# Altium footprint library smd-ipc.PCBLIB: 363 footprints (part 13 of 27)
Each footprint in its own frame and in the unit in brackets; x right, y up, seen from the top. Pads: shape width x height; smd on the part's side, far side on the other; paste and mask are expansions set on the pad; w line width, h text height; cw(c..) or ccw(c..) is an arc to the next point about the centre after c.
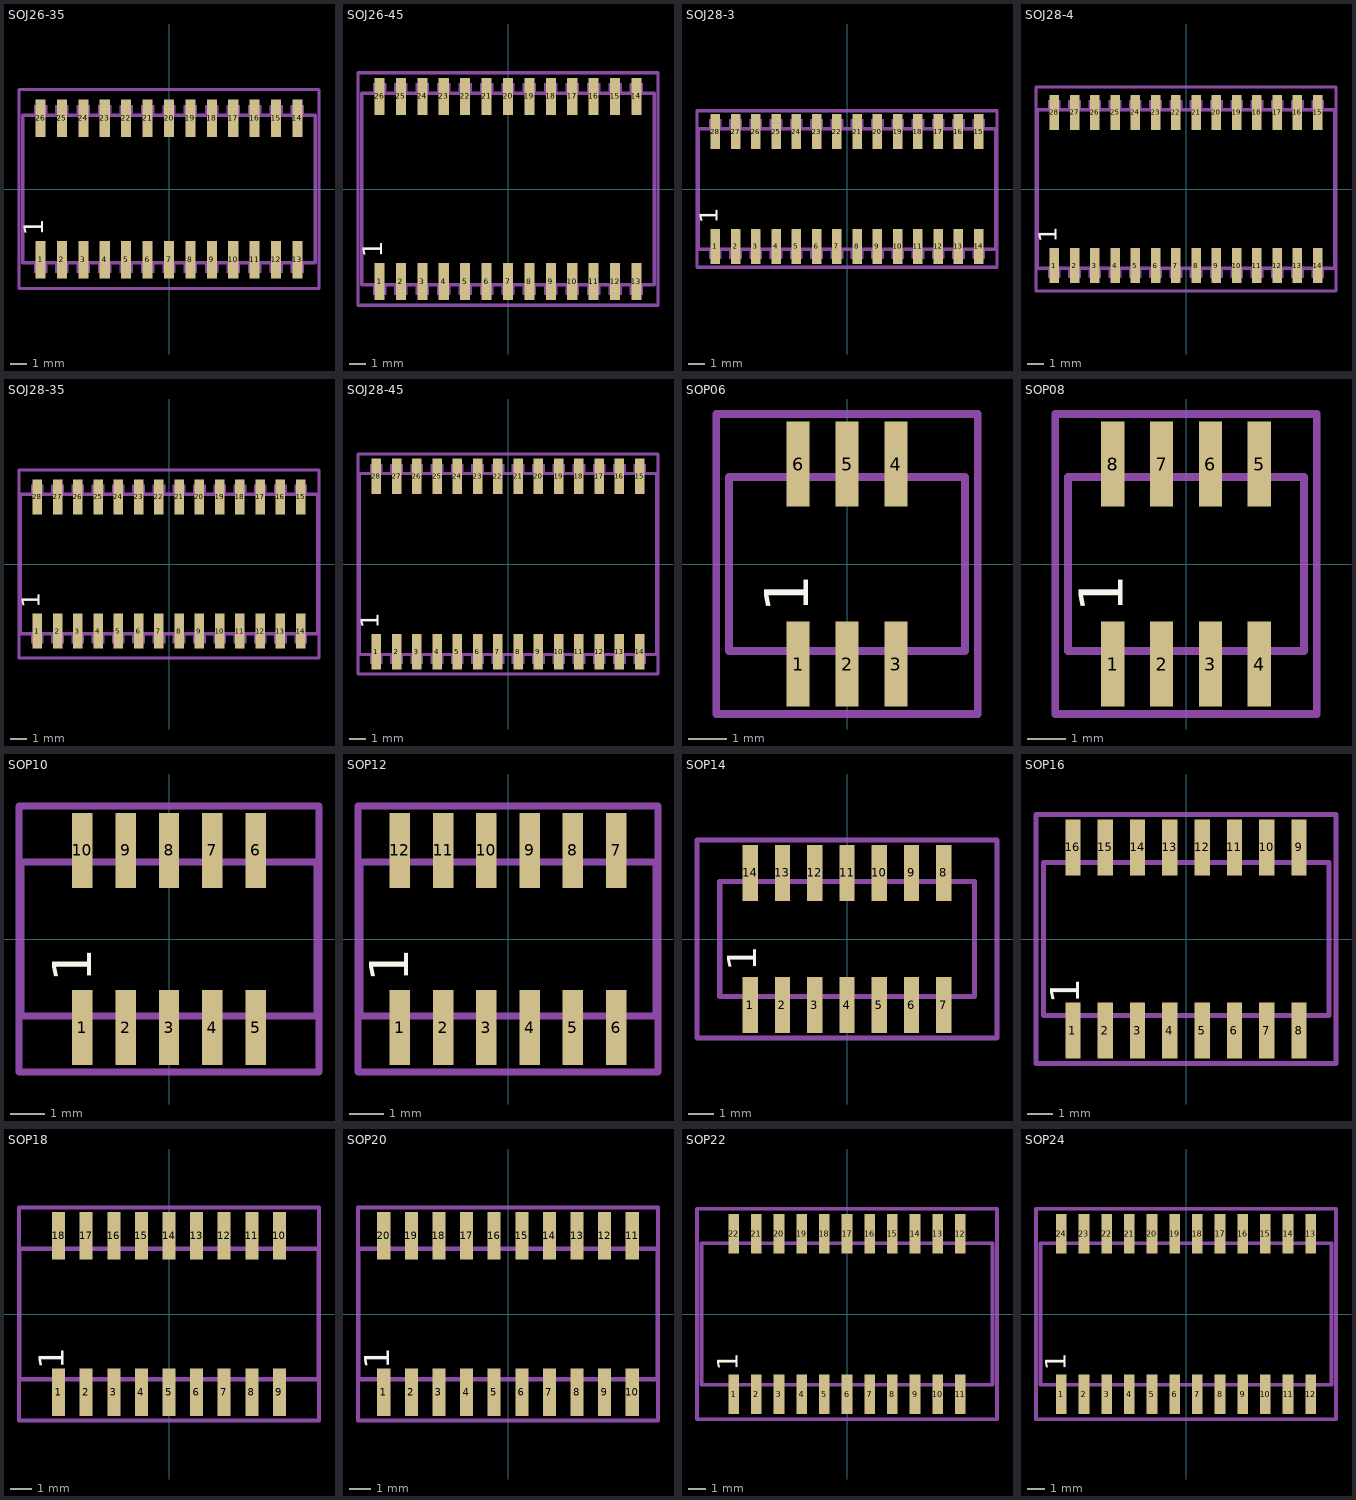
[diagram p12: the footprints below, top view; thin cyan lines are the x and y axes]

## SOJ26-35 [mm]
pads (26):
  rect 0.6x2.2 smd: 1(-7.62,-4.2) 2(-6.35,-4.2) 3(-5.08,-4.2) 4(-3.81,-4.2) 5(-2.54,-4.2) 6(-1.27,-4.2) 7(0,-4.2) 8(1.27,-4.2) 9(2.54,-4.2) 10(3.81,-4.2) 11(5.08,-4.2) 12(6.35,-4.2) 13(7.62,-4.2) 14(7.62,4.2) 15(6.35,4.2) 16(5.08,4.2) 17(3.81,4.2) 18(2.54,4.2) 19(1.27,4.2) 20(0,4.2) 21(-1.27,4.2) 22(-2.54,4.2) 23(-3.81,4.2) 24(-5.08,4.2) 25(-6.35,4.2) 26(-7.62,4.2)
Top Overlay:
  text "1" at -7.075,-2.77 h1.97
Mechanical 16:
  rectangle: -7.87,-4.27 -7.37,-3.13
  rectangle: -8.02,-4.98 -7.22,-4.47
  rectangle: -6.6,-4.27 -6.1,-3.13
  rectangle: -6.75,-4.98 -5.95,-4.47
  rectangle: -5.33,-4.27 -4.83,-3.13
  rectangle: -5.48,-4.98 -4.68,-4.47
  rectangle: -4.06,-4.27 -3.56,-3.13
  rectangle: -4.21,-4.98 -3.41,-4.47
  rectangle: -2.79,-4.27 -2.29,-3.13
  rectangle: -2.94,-4.98 -2.14,-4.47
  rectangle: -1.52,-4.27 -1.02,-3.13
  rectangle: -1.67,-4.98 -0.87,-4.47
  rectangle: -0.25,-4.27 0.25,-3.13
  rectangle: -0.4,-4.98 0.4,-4.47
  rectangle: 1.02,-4.27 1.52,-3.13
  rectangle: 0.87,-4.98 1.67,-4.47
  rectangle: 2.29,-4.27 2.79,-3.13
  rectangle: 2.14,-4.98 2.94,-4.47
  rectangle: 3.56,-4.27 4.06,-3.13
  rectangle: 3.41,-4.98 4.21,-4.47
  rectangle: 4.83,-4.27 5.33,-3.13
  rectangle: 4.68,-4.98 5.48,-4.47
  rectangle: 6.1,-4.27 6.6,-3.13
  rectangle: 5.95,-4.98 6.75,-4.47
  rectangle: 7.37,-4.27 7.87,-3.13
  rectangle: 7.22,-4.98 8.02,-4.47
  rectangle: 7.37,3.13 7.87,4.27
  rectangle: 7.22,4.47 8.02,4.98
  rectangle: 6.1,3.13 6.6,4.27
  rectangle: 5.95,4.47 6.75,4.98
  rectangle: 4.83,3.13 5.33,4.27
  rectangle: 4.68,4.47 5.48,4.98
  rectangle: 3.56,3.13 4.06,4.27
  rectangle: 3.41,4.47 4.21,4.98
  rectangle: 2.29,3.13 2.79,4.27
  rectangle: 2.14,4.47 2.94,4.98
  rectangle: 1.02,3.13 1.52,4.27
  rectangle: 0.87,4.47 1.67,4.98
  rectangle: -0.25,3.13 0.25,4.27
  rectangle: -0.4,4.47 0.4,4.98
  rectangle: -1.52,3.13 -1.02,4.27
  rectangle: -1.67,4.47 -0.87,4.98
  rectangle: -2.79,3.13 -2.29,4.27
  rectangle: -2.94,4.47 -2.14,4.98
  rectangle: -4.06,3.13 -3.56,4.27
  rectangle: -4.21,4.47 -3.41,4.98
  rectangle: -5.33,3.13 -4.83,4.27
  rectangle: -5.48,4.47 -4.68,4.98
  rectangle: -6.6,3.13 -6.1,4.27
  rectangle: -6.75,4.47 -5.95,4.98
  rectangle: -7.87,3.13 -7.37,4.27
  rectangle: -8.02,4.47 -7.22,4.98
  lines w0.203: -8.685,-4.37 8.675,-4.37 8.675,4.37 -8.685,4.37 -8.685,-4.37
Mechanical 27:
  lines w0.2: -8.9,-5.9 -8.9,5.9 8.9,5.9 8.9,-5.9 -8.9,-5.9

## SOJ26-45 [mm]
pads (26):
  rect 0.6x2.2 smd: 1(-7.62,-5.5) 2(-6.35,-5.5) 3(-5.08,-5.5) 4(-3.81,-5.5) 5(-2.54,-5.5) 6(-1.27,-5.5) 7(0,-5.5) 8(1.27,-5.5) 9(2.54,-5.5) 10(3.81,-5.5) 11(5.08,-5.5) 12(6.35,-5.5) 13(7.62,-5.5) 14(7.62,5.5) 15(6.35,5.5) 16(5.08,5.5) 17(3.81,5.5) 18(2.54,5.5) 19(1.27,5.5) 20(0,5.5) 21(-1.27,5.5) 22(-2.54,5.5) 23(-3.81,5.5) 24(-5.08,5.5) 25(-6.35,5.5) 26(-7.62,5.5)
Top Overlay:
  text "1" at -7.075,-4.07 h1.97
Mechanical 16:
  rectangle: -7.87,-5.57 -7.37,-4.43
  rectangle: -8.02,-6.28 -7.22,-5.77
  rectangle: -6.6,-5.57 -6.1,-4.43
  rectangle: -6.75,-6.28 -5.95,-5.77
  rectangle: -5.33,-5.57 -4.83,-4.43
  rectangle: -5.48,-6.28 -4.68,-5.77
  rectangle: -4.06,-5.57 -3.56,-4.43
  rectangle: -4.21,-6.28 -3.41,-5.77
  rectangle: -2.79,-5.57 -2.29,-4.43
  rectangle: -2.94,-6.28 -2.14,-5.77
  rectangle: -1.52,-5.57 -1.02,-4.43
  rectangle: -1.67,-6.28 -0.87,-5.77
  rectangle: -0.25,-5.57 0.25,-4.43
  rectangle: -0.4,-6.28 0.4,-5.77
  rectangle: 1.02,-5.57 1.52,-4.43
  rectangle: 0.87,-6.28 1.67,-5.77
  rectangle: 2.29,-5.57 2.79,-4.43
  rectangle: 2.14,-6.28 2.94,-5.77
  rectangle: 3.56,-5.57 4.06,-4.43
  rectangle: 3.41,-6.28 4.21,-5.77
  rectangle: 4.83,-5.57 5.33,-4.43
  rectangle: 4.68,-6.28 5.48,-5.77
  rectangle: 6.1,-5.57 6.6,-4.43
  rectangle: 5.95,-6.28 6.75,-5.77
  rectangle: 7.37,-5.57 7.87,-4.43
  rectangle: 7.22,-6.28 8.02,-5.77
  rectangle: 7.37,4.43 7.87,5.57
  rectangle: 7.22,5.77 8.02,6.28
  rectangle: 6.1,4.43 6.6,5.57
  rectangle: 5.95,5.77 6.75,6.28
  rectangle: 4.83,4.43 5.33,5.57
  rectangle: 4.68,5.77 5.48,6.28
  rectangle: 3.56,4.43 4.06,5.57
  rectangle: 3.41,5.77 4.21,6.28
  rectangle: 2.29,4.43 2.79,5.57
  rectangle: 2.14,5.77 2.94,6.28
  rectangle: 1.02,4.43 1.52,5.57
  rectangle: 0.87,5.77 1.67,6.28
  rectangle: -0.25,4.43 0.25,5.57
  rectangle: -0.4,5.77 0.4,6.28
  rectangle: -1.52,4.43 -1.02,5.57
  rectangle: -1.67,5.77 -0.87,6.28
  rectangle: -2.79,4.43 -2.29,5.57
  rectangle: -2.94,5.77 -2.14,6.28
  rectangle: -4.06,4.43 -3.56,5.57
  rectangle: -4.21,5.77 -3.41,6.28
  rectangle: -5.33,4.43 -4.83,5.57
  rectangle: -5.48,5.77 -4.68,6.28
  rectangle: -6.6,4.43 -6.1,5.57
  rectangle: -6.75,5.77 -5.95,6.28
  rectangle: -7.87,4.43 -7.37,5.57
  rectangle: -8.02,5.77 -7.22,6.28
  lines w0.203: -8.685,-5.67 8.675,-5.67 8.675,5.67 -8.685,5.67 -8.685,-5.67
Mechanical 27:
  lines w0.2: -8.9,-6.9 -8.9,6.9 8.9,6.9 8.9,-6.9 -8.9,-6.9

## SOJ28-3 [mm]
pads (28):
  rect 0.6x2.2 smd: 1(-8.255,-3.6) 2(-6.985,-3.6) 3(-5.715,-3.6) 4(-4.445,-3.6) 5(-3.175,-3.6) 6(-1.905,-3.6) 7(-0.635,-3.6) 8(0.635,-3.6) 9(1.905,-3.6) 10(3.175,-3.6) 11(4.445,-3.6) 12(5.715,-3.6) 13(6.985,-3.6) 14(8.255,-3.6) 15(8.255,3.6) 16(6.985,3.6) 17(5.715,3.6) 18(4.445,3.6) 19(3.175,3.6) 20(1.905,3.6) 21(0.635,3.6) 22(-0.635,3.6) 23(-1.905,3.6) 24(-3.175,3.6) 25(-4.445,3.6) 26(-5.715,3.6) 27(-6.985,3.6) 28(-8.255,3.6)
Top Overlay:
  text "1" at -7.71,-2.17 h1.97
Mechanical 16:
  rectangle: -8.505,-3.67 -8.005,-2.53
  rectangle: -8.655,-4.38 -7.855,-3.87
  rectangle: -7.235,-3.67 -6.735,-2.53
  rectangle: -7.385,-4.38 -6.585,-3.87
  rectangle: -5.965,-3.67 -5.465,-2.53
  rectangle: -6.115,-4.38 -5.315,-3.87
  rectangle: -4.695,-3.67 -4.195,-2.53
  rectangle: -4.845,-4.38 -4.045,-3.87
  rectangle: -3.425,-3.67 -2.925,-2.53
  rectangle: -3.575,-4.38 -2.775,-3.87
  rectangle: -2.155,-3.67 -1.655,-2.53
  rectangle: -2.305,-4.38 -1.505,-3.87
  rectangle: -0.885,-3.67 -0.385,-2.53
  rectangle: -1.035,-4.38 -0.235,-3.87
  rectangle: 0.385,-3.67 0.885,-2.53
  rectangle: 0.235,-4.38 1.035,-3.87
  rectangle: 1.655,-3.67 2.155,-2.53
  rectangle: 1.505,-4.38 2.305,-3.87
  rectangle: 2.925,-3.67 3.425,-2.53
  rectangle: 2.775,-4.38 3.575,-3.87
  rectangle: 4.195,-3.67 4.695,-2.53
  rectangle: 4.045,-4.38 4.845,-3.87
  rectangle: 5.465,-3.67 5.965,-2.53
  rectangle: 5.315,-4.38 6.115,-3.87
  rectangle: 6.735,-3.67 7.235,-2.53
  rectangle: 6.585,-4.38 7.385,-3.87
  rectangle: 8.005,-3.67 8.505,-2.53
  rectangle: 7.855,-4.38 8.655,-3.87
  rectangle: 8.005,2.53 8.505,3.67
  rectangle: 7.855,3.87 8.655,4.38
  rectangle: 6.735,2.53 7.235,3.67
  rectangle: 6.585,3.87 7.385,4.38
  rectangle: 5.465,2.53 5.965,3.67
  rectangle: 5.315,3.87 6.115,4.38
  rectangle: 4.195,2.53 4.695,3.67
  rectangle: 4.045,3.87 4.845,4.38
  rectangle: 2.925,2.53 3.425,3.67
  rectangle: 2.775,3.87 3.575,4.38
  rectangle: 1.655,2.53 2.155,3.67
  rectangle: 1.505,3.87 2.305,4.38
  rectangle: 0.385,2.53 0.885,3.67
  rectangle: 0.235,3.87 1.035,4.38
  rectangle: -0.885,2.53 -0.385,3.67
  rectangle: -1.035,3.87 -0.235,4.38
  rectangle: -2.155,2.53 -1.655,3.67
  rectangle: -2.305,3.87 -1.505,4.38
  rectangle: -3.425,2.53 -2.925,3.67
  rectangle: -3.575,3.87 -2.775,4.38
  rectangle: -4.695,2.53 -4.195,3.67
  rectangle: -4.845,3.87 -4.045,4.38
  rectangle: -5.965,2.53 -5.465,3.67
  rectangle: -6.115,3.87 -5.315,4.38
  rectangle: -7.235,2.53 -6.735,3.67
  rectangle: -7.385,3.87 -6.585,4.38
  rectangle: -8.505,2.53 -8.005,3.67
  rectangle: -8.655,3.87 -7.855,4.38
  lines w0.203: -9.32,-3.77 9.31,-3.77 9.31,3.77 -9.32,3.77 -9.32,-3.77
Mechanical 27:
  lines w0.2: -9.4,-4.9 -9.4,4.9 9.4,4.9 9.4,-4.9 -9.4,-4.9

## SOJ28-4 [mm]
pads (28):
  rect 0.6x2.2 smd: 1(-8.255,-4.8) 2(-6.985,-4.8) 3(-5.715,-4.8) 4(-4.445,-4.8) 5(-3.175,-4.8) 6(-1.905,-4.8) 7(-0.635,-4.8) 8(0.635,-4.8) 9(1.905,-4.8) 10(3.175,-4.8) 11(4.445,-4.8) 12(5.715,-4.8) 13(6.985,-4.8) 14(8.255,-4.8) 15(8.255,4.8) 16(6.985,4.8) 17(5.715,4.8) 18(4.445,4.8) 19(3.175,4.8) 20(1.905,4.8) 21(0.635,4.8) 22(-0.635,4.8) 23(-1.905,4.8) 24(-3.175,4.8) 25(-4.445,4.8) 26(-5.715,4.8) 27(-6.985,4.8) 28(-8.255,4.8)
Top Overlay:
  text "1" at -7.71,-3.37 h1.97
Mechanical 16:
  rectangle: -8.505,-4.87 -8.005,-3.73
  rectangle: -8.655,-5.58 -7.855,-5.07
  rectangle: -7.235,-4.87 -6.735,-3.73
  rectangle: -7.385,-5.58 -6.585,-5.07
  rectangle: -5.965,-4.87 -5.465,-3.73
  rectangle: -6.115,-5.58 -5.315,-5.07
  rectangle: -4.695,-4.87 -4.195,-3.73
  rectangle: -4.845,-5.58 -4.045,-5.07
  rectangle: -3.425,-4.87 -2.925,-3.73
  rectangle: -3.575,-5.58 -2.775,-5.07
  rectangle: -2.155,-4.87 -1.655,-3.73
  rectangle: -2.305,-5.58 -1.505,-5.07
  rectangle: -0.885,-4.87 -0.385,-3.73
  rectangle: -1.035,-5.58 -0.235,-5.07
  rectangle: 0.385,-4.87 0.885,-3.73
  rectangle: 0.235,-5.58 1.035,-5.07
  rectangle: 1.655,-4.87 2.155,-3.73
  rectangle: 1.505,-5.58 2.305,-5.07
  rectangle: 2.925,-4.87 3.425,-3.73
  rectangle: 2.775,-5.58 3.575,-5.07
  rectangle: 4.195,-4.87 4.695,-3.73
  rectangle: 4.045,-5.58 4.845,-5.07
  rectangle: 5.465,-4.87 5.965,-3.73
  rectangle: 5.315,-5.58 6.115,-5.07
  rectangle: 6.735,-4.87 7.235,-3.73
  rectangle: 6.585,-5.58 7.385,-5.07
  rectangle: 8.005,-4.87 8.505,-3.73
  rectangle: 7.855,-5.58 8.655,-5.07
  rectangle: 8.005,3.73 8.505,4.87
  rectangle: 7.855,5.07 8.655,5.58
  rectangle: 6.735,3.73 7.235,4.87
  rectangle: 6.585,5.07 7.385,5.58
  rectangle: 5.465,3.73 5.965,4.87
  rectangle: 5.315,5.07 6.115,5.58
  rectangle: 4.195,3.73 4.695,4.87
  rectangle: 4.045,5.07 4.845,5.58
  rectangle: 2.925,3.73 3.425,4.87
  rectangle: 2.775,5.07 3.575,5.58
  rectangle: 1.655,3.73 2.155,4.87
  rectangle: 1.505,5.07 2.305,5.58
  rectangle: 0.385,3.73 0.885,4.87
  rectangle: 0.235,5.07 1.035,5.58
  rectangle: -0.885,3.73 -0.385,4.87
  rectangle: -1.035,5.07 -0.235,5.58
  rectangle: -2.155,3.73 -1.655,4.87
  rectangle: -2.305,5.07 -1.505,5.58
  rectangle: -3.425,3.73 -2.925,4.87
  rectangle: -3.575,5.07 -2.775,5.58
  rectangle: -4.695,3.73 -4.195,4.87
  rectangle: -4.845,5.07 -4.045,5.58
  rectangle: -5.965,3.73 -5.465,4.87
  rectangle: -6.115,5.07 -5.315,5.58
  rectangle: -7.235,3.73 -6.735,4.87
  rectangle: -7.385,5.07 -6.585,5.58
  rectangle: -8.505,3.73 -8.005,4.87
  rectangle: -8.655,5.07 -7.855,5.58
  lines w0.203: -9.32,-4.97 9.31,-4.97 9.31,4.97 -9.32,4.97 -9.32,-4.97
Mechanical 27:
  lines w0.2: -9.4,-6.4 -9.4,6.4 9.4,6.4 9.4,-6.4 -9.4,-6.4

## SOJ28-35 [mm]
pads (28):
  rect 0.6x2.2 smd: 1(-8.255,-4.2) 2(-6.985,-4.2) 3(-5.715,-4.2) 4(-4.445,-4.2) 5(-3.175,-4.2) 6(-1.905,-4.2) 7(-0.635,-4.2) 8(0.635,-4.2) 9(1.905,-4.2) 10(3.175,-4.2) 11(4.445,-4.2) 12(5.715,-4.2) 13(6.985,-4.2) 14(8.255,-4.2) 15(8.255,4.2) 16(6.985,4.2) 17(5.715,4.2) 18(4.445,4.2) 19(3.175,4.2) 20(1.905,4.2) 21(0.635,4.2) 22(-0.635,4.2) 23(-1.905,4.2) 24(-3.175,4.2) 25(-4.445,4.2) 26(-5.715,4.2) 27(-6.985,4.2) 28(-8.255,4.2)
Top Overlay:
  text "1" at -7.71,-2.77 h1.97
Mechanical 16:
  rectangle: -8.505,-4.27 -8.005,-3.13
  rectangle: -8.655,-4.98 -7.855,-4.47
  rectangle: -7.235,-4.27 -6.735,-3.13
  rectangle: -7.385,-4.98 -6.585,-4.47
  rectangle: -5.965,-4.27 -5.465,-3.13
  rectangle: -6.115,-4.98 -5.315,-4.47
  rectangle: -4.695,-4.27 -4.195,-3.13
  rectangle: -4.845,-4.98 -4.045,-4.47
  rectangle: -3.425,-4.27 -2.925,-3.13
  rectangle: -3.575,-4.98 -2.775,-4.47
  rectangle: -2.155,-4.27 -1.655,-3.13
  rectangle: -2.305,-4.98 -1.505,-4.47
  rectangle: -0.885,-4.27 -0.385,-3.13
  rectangle: -1.035,-4.98 -0.235,-4.47
  rectangle: 0.385,-4.27 0.885,-3.13
  rectangle: 0.235,-4.98 1.035,-4.47
  rectangle: 1.655,-4.27 2.155,-3.13
  rectangle: 1.505,-4.98 2.305,-4.47
  rectangle: 2.925,-4.27 3.425,-3.13
  rectangle: 2.775,-4.98 3.575,-4.47
  rectangle: 4.195,-4.27 4.695,-3.13
  rectangle: 4.045,-4.98 4.845,-4.47
  rectangle: 5.465,-4.27 5.965,-3.13
  rectangle: 5.315,-4.98 6.115,-4.47
  rectangle: 6.735,-4.27 7.235,-3.13
  rectangle: 6.585,-4.98 7.385,-4.47
  rectangle: 8.005,-4.27 8.505,-3.13
  rectangle: 7.855,-4.98 8.655,-4.47
  rectangle: 8.005,3.13 8.505,4.27
  rectangle: 7.855,4.47 8.655,4.98
  rectangle: 6.735,3.13 7.235,4.27
  rectangle: 6.585,4.47 7.385,4.98
  rectangle: 5.465,3.13 5.965,4.27
  rectangle: 5.315,4.47 6.115,4.98
  rectangle: 4.195,3.13 4.695,4.27
  rectangle: 4.045,4.47 4.845,4.98
  rectangle: 2.925,3.13 3.425,4.27
  rectangle: 2.775,4.47 3.575,4.98
  rectangle: 1.655,3.13 2.155,4.27
  rectangle: 1.505,4.47 2.305,4.98
  rectangle: 0.385,3.13 0.885,4.27
  rectangle: 0.235,4.47 1.035,4.98
  rectangle: -0.885,3.13 -0.385,4.27
  rectangle: -1.035,4.47 -0.235,4.98
  rectangle: -2.155,3.13 -1.655,4.27
  rectangle: -2.305,4.47 -1.505,4.98
  rectangle: -3.425,3.13 -2.925,4.27
  rectangle: -3.575,4.47 -2.775,4.98
  rectangle: -4.695,3.13 -4.195,4.27
  rectangle: -4.845,4.47 -4.045,4.98
  rectangle: -5.965,3.13 -5.465,4.27
  rectangle: -6.115,4.47 -5.315,4.98
  rectangle: -7.235,3.13 -6.735,4.27
  rectangle: -7.385,4.47 -6.585,4.98
  rectangle: -8.505,3.13 -8.005,4.27
  rectangle: -8.655,4.47 -7.855,4.98
  lines w0.203: -9.32,-4.37 9.31,-4.37 9.31,4.37 -9.32,4.37 -9.32,-4.37
Mechanical 27:
  lines w0.2: -9.4,-5.9 -9.4,5.9 9.4,5.9 9.4,-5.9 -9.4,-5.9

## SOJ28-45 [mm]
pads (28):
  rect 0.6x2.2 smd: 1(-8.255,-5.5) 2(-6.985,-5.5) 3(-5.715,-5.5) 4(-4.445,-5.5) 5(-3.175,-5.5) 6(-1.905,-5.5) 7(-0.635,-5.5) 8(0.635,-5.5) 9(1.905,-5.5) 10(3.175,-5.5) 11(4.445,-5.5) 12(5.715,-5.5) 13(6.985,-5.5) 14(8.255,-5.5) 15(8.255,5.5) 16(6.985,5.5) 17(5.715,5.5) 18(4.445,5.5) 19(3.175,5.5) 20(1.905,5.5) 21(0.635,5.5) 22(-0.635,5.5) 23(-1.905,5.5) 24(-3.175,5.5) 25(-4.445,5.5) 26(-5.715,5.5) 27(-6.985,5.5) 28(-8.255,5.5)
Top Overlay:
  text "1" at -7.71,-4.07 h1.97
Mechanical 16:
  rectangle: -8.505,-5.57 -8.005,-4.43
  rectangle: -8.655,-6.28 -7.855,-5.77
  rectangle: -7.235,-5.57 -6.735,-4.43
  rectangle: -7.385,-6.28 -6.585,-5.77
  rectangle: -5.965,-5.57 -5.465,-4.43
  rectangle: -6.115,-6.28 -5.315,-5.77
  rectangle: -4.695,-5.57 -4.195,-4.43
  rectangle: -4.845,-6.28 -4.045,-5.77
  rectangle: -3.425,-5.57 -2.925,-4.43
  rectangle: -3.575,-6.28 -2.775,-5.77
  rectangle: -2.155,-5.57 -1.655,-4.43
  rectangle: -2.305,-6.28 -1.505,-5.77
  rectangle: -0.885,-5.57 -0.385,-4.43
  rectangle: -1.035,-6.28 -0.235,-5.77
  rectangle: 0.385,-5.57 0.885,-4.43
  rectangle: 0.235,-6.28 1.035,-5.77
  rectangle: 1.655,-5.57 2.155,-4.43
  rectangle: 1.505,-6.28 2.305,-5.77
  rectangle: 2.925,-5.57 3.425,-4.43
  rectangle: 2.775,-6.28 3.575,-5.77
  rectangle: 4.195,-5.57 4.695,-4.43
  rectangle: 4.045,-6.28 4.845,-5.77
  rectangle: 5.465,-5.57 5.965,-4.43
  rectangle: 5.315,-6.28 6.115,-5.77
  rectangle: 6.735,-5.57 7.235,-4.43
  rectangle: 6.585,-6.28 7.385,-5.77
  rectangle: 8.005,-5.57 8.505,-4.43
  rectangle: 7.855,-6.28 8.655,-5.77
  rectangle: 8.005,4.43 8.505,5.57
  rectangle: 7.855,5.77 8.655,6.28
  rectangle: 6.735,4.43 7.235,5.57
  rectangle: 6.585,5.77 7.385,6.28
  rectangle: 5.465,4.43 5.965,5.57
  rectangle: 5.315,5.77 6.115,6.28
  rectangle: 4.195,4.43 4.695,5.57
  rectangle: 4.045,5.77 4.845,6.28
  rectangle: 2.925,4.43 3.425,5.57
  rectangle: 2.775,5.77 3.575,6.28
  rectangle: 1.655,4.43 2.155,5.57
  rectangle: 1.505,5.77 2.305,6.28
  rectangle: 0.385,4.43 0.885,5.57
  rectangle: 0.235,5.77 1.035,6.28
  rectangle: -0.885,4.43 -0.385,5.57
  rectangle: -1.035,5.77 -0.235,6.28
  rectangle: -2.155,4.43 -1.655,5.57
  rectangle: -2.305,5.77 -1.505,6.28
  rectangle: -3.425,4.43 -2.925,5.57
  rectangle: -3.575,5.77 -2.775,6.28
  rectangle: -4.695,4.43 -4.195,5.57
  rectangle: -4.845,5.77 -4.045,6.28
  rectangle: -5.965,4.43 -5.465,5.57
  rectangle: -6.115,5.77 -5.315,6.28
  rectangle: -7.235,4.43 -6.735,5.57
  rectangle: -7.385,5.77 -6.585,6.28
  rectangle: -8.505,4.43 -8.005,5.57
  rectangle: -8.655,5.77 -7.855,6.28
  lines w0.203: -9.32,-5.67 9.31,-5.67 9.31,5.67 -9.32,5.67 -9.32,-5.67
Mechanical 27:
  lines w0.2: -9.4,-6.9 -9.4,6.9 9.4,6.9 9.4,-6.9 -9.4,-6.9

## SOP06 [mm]
pads (6):
  rect 0.6x2.2 smd: 1(-1.27,-2.6) 2(0,-2.6) 3(1.27,-2.6) 4(1.27,2.6) 5(0,2.6) 6(-1.27,2.6)
Top Overlay:
  text "1" at -0.635,-1.27 h1.97
Mechanical 16:
  rectangle: -1.52,-3.49 -1.02,-2.36
  rectangle: -0.25,-3.49 0.25,-2.36
  rectangle: 1.02,-3.49 1.52,-2.36
  rectangle: 1.02,2.36 1.52,3.49
  rectangle: -0.25,2.36 0.25,3.49
  rectangle: -1.52,2.36 -1.02,3.49
  lines w0.203: -3.07,-2.26 3.07,-2.26 3.07,2.26 -3.07,2.26 -3.07,-2.26
Mechanical 27:
  lines w0.2: -3.4,-3.9 -3.4,3.9 3.4,3.9 3.4,-3.9 -3.4,-3.9

## SOP08 [mm]
pads (8):
  rect 0.6x2.2 smd: 1(-1.905,-2.6) 2(-0.635,-2.6) 3(0.635,-2.6) 4(1.905,-2.6) 5(1.905,2.6) 6(0.635,2.6) 7(-0.635,2.6) 8(-1.905,2.6)
Top Overlay:
  text "1" at -1.27,-1.27 h1.97
Mechanical 16:
  rectangle: -2.155,-3.49 -1.655,-2.36
  rectangle: -0.885,-3.49 -0.385,-2.36
  rectangle: 0.385,-3.49 0.885,-2.36
  rectangle: 1.655,-3.49 2.155,-2.36
  rectangle: 1.655,2.36 2.155,3.49
  rectangle: 0.385,2.36 0.885,3.49
  rectangle: -0.885,2.36 -0.385,3.49
  rectangle: -2.155,2.36 -1.655,3.49
  lines w0.203: -3.07,-2.26 3.07,-2.26 3.07,2.26 -3.07,2.26 -3.07,-2.26
Mechanical 27:
  lines w0.2: -3.4,-3.9 -3.4,3.9 3.4,3.9 3.4,-3.9 -3.4,-3.9

## SOP10 [mm]
pads (10):
  rect 0.6x2.2 smd: 1(-2.54,-2.6) 2(-1.27,-2.6) 3(0,-2.6) 4(1.27,-2.6) 5(2.54,-2.6) 6(2.54,2.6) 7(1.27,2.6) 8(0,2.6) 9(-1.27,2.6) 10(-2.54,2.6)
Top Overlay:
  text "1" at -1.905,-1.27 h1.97
Mechanical 16:
  rectangle: -2.79,-3.49 -2.29,-2.36
  rectangle: -1.52,-3.49 -1.02,-2.36
  rectangle: -0.25,-3.49 0.25,-2.36
  rectangle: 1.02,-3.49 1.52,-2.36
  rectangle: 2.29,-3.49 2.79,-2.36
  rectangle: 2.29,2.36 2.79,3.49
  rectangle: 1.02,2.36 1.52,3.49
  rectangle: -0.25,2.36 0.25,3.49
  rectangle: -1.52,2.36 -1.02,3.49
  rectangle: -2.79,2.36 -2.29,3.49
  lines w0.203: -4.345,-2.26 4.345,-2.26 4.345,2.26 -4.345,2.26 -4.345,-2.26
Mechanical 27:
  lines w0.2: -4.4,-3.9 -4.4,3.9 4.4,3.9 4.4,-3.9 -4.4,-3.9

## SOP12 [mm]
pads (12):
  rect 0.6x2.2 smd: 1(-3.175,-2.6) 2(-1.905,-2.6) 3(-0.635,-2.6) 4(0.635,-2.6) 5(1.905,-2.6) 6(3.175,-2.6) 7(3.175,2.6) 8(1.905,2.6) 9(0.635,2.6) 10(-0.635,2.6) 11(-1.905,2.6) 12(-3.175,2.6)
Top Overlay:
  text "1" at -2.54,-1.27 h1.97
Mechanical 16:
  rectangle: -3.425,-3.49 -2.925,-2.36
  rectangle: -2.155,-3.49 -1.655,-2.36
  rectangle: -0.885,-3.49 -0.385,-2.36
  rectangle: 0.385,-3.49 0.885,-2.36
  rectangle: 1.655,-3.49 2.155,-2.36
  rectangle: 2.925,-3.49 3.425,-2.36
  rectangle: 2.925,2.36 3.425,3.49
  rectangle: 1.655,2.36 2.155,3.49
  rectangle: 0.385,2.36 0.885,3.49
  rectangle: -0.885,2.36 -0.385,3.49
  rectangle: -2.155,2.36 -1.655,3.49
  rectangle: -3.425,2.36 -2.925,3.49
  lines w0.203: -4.345,-2.26 4.345,-2.26 4.345,2.26 -4.345,2.26 -4.345,-2.26
Mechanical 27:
  lines w0.2: -4.4,-3.9 -4.4,3.9 4.4,3.9 4.4,-3.9 -4.4,-3.9

## SOP14 [mm]
pads (14):
  rect 0.6x2.2 smd: 1(-3.81,-2.6) 2(-2.54,-2.6) 3(-1.27,-2.6) 4(0,-2.6) 5(1.27,-2.6) 6(2.54,-2.6) 7(3.81,-2.6) 8(3.81,2.6) 9(2.54,2.6) 10(1.27,2.6) 11(0,2.6) 12(-1.27,2.6) 13(-2.54,2.6) 14(-3.81,2.6)
Top Overlay:
  text "1" at -3.175,-1.27 h1.97
Mechanical 16:
  rectangle: -4.06,-3.49 -3.56,-2.36
  rectangle: -2.79,-3.49 -2.29,-2.36
  rectangle: -1.52,-3.49 -1.02,-2.36
  rectangle: -0.25,-3.49 0.25,-2.36
  rectangle: 1.02,-3.49 1.52,-2.36
  rectangle: 2.29,-3.49 2.79,-2.36
  rectangle: 3.56,-3.49 4.06,-2.36
  rectangle: 3.56,2.36 4.06,3.49
  rectangle: 2.29,2.36 2.79,3.49
  rectangle: 1.02,2.36 1.52,3.49
  rectangle: -0.25,2.36 0.25,3.49
  rectangle: -1.52,2.36 -1.02,3.49
  rectangle: -2.79,2.36 -2.29,3.49
  rectangle: -4.06,2.36 -3.56,3.49
  lines w0.203: -5.005,-2.26 5.015,-2.26 5.015,2.26 -5.005,2.26 -5.005,-2.26
Mechanical 27:
  lines w0.2: -5.9,-3.9 -5.9,3.9 5.9,3.9 5.9,-3.9 -5.9,-3.9

## SOP16 [mm]
pads (16):
  rect 0.6x2.2 smd: 1(-4.445,-3.6) 2(-3.175,-3.6) 3(-1.905,-3.6) 4(-0.635,-3.6) 5(0.635,-3.6) 6(1.905,-3.6) 7(3.175,-3.6) 8(4.445,-3.6) 9(4.445,3.6) 10(3.175,3.6) 11(1.905,3.6) 12(0.635,3.6) 13(-0.635,3.6) 14(-1.905,3.6) 15(-3.175,3.6) 16(-4.445,3.6)
Top Overlay:
  text "1" at -3.81,-2.54 h1.97
Mechanical 16:
  rectangle: -4.695,-4.44 -4.195,-3.11
  rectangle: -3.425,-4.44 -2.925,-3.11
  rectangle: -2.155,-4.44 -1.655,-3.11
  rectangle: -0.885,-4.44 -0.385,-3.11
  rectangle: 0.385,-4.44 0.885,-3.11
  rectangle: 1.655,-4.44 2.155,-3.11
  rectangle: 2.925,-4.44 3.425,-3.11
  rectangle: 4.195,-4.44 4.695,-3.11
  rectangle: 4.195,3.11 4.695,4.44
  rectangle: 2.925,3.11 3.425,4.44
  rectangle: 1.655,3.11 2.155,4.44
  rectangle: 0.385,3.11 0.885,4.44
  rectangle: -0.885,3.11 -0.385,4.44
  rectangle: -2.155,3.11 -1.655,4.44
  rectangle: -3.425,3.11 -2.925,4.44
  rectangle: -4.695,3.11 -4.195,4.44
  lines w0.203: -5.605,-3.01 -5.605,3.01 5.625,3.01 5.625,-3.01 -5.605,-3.01
Mechanical 27:
  lines w0.2: -5.9,-4.9 -5.9,4.9 5.9,4.9 5.9,-4.9 -5.9,-4.9

## SOP18 [mm]
pads (18):
  rect 0.6x2.2 smd: 1(-5.08,-3.6) 2(-3.81,-3.6) 3(-2.54,-3.6) 4(-1.27,-3.6) 5(0,-3.6) 6(1.27,-3.6) 7(2.54,-3.6) 8(3.81,-3.6) 9(5.08,-3.6) 10(5.08,3.6) 11(3.81,3.6) 12(2.54,3.6) 13(1.27,3.6) 14(0,3.6) 15(-1.27,3.6) 16(-2.54,3.6) 17(-3.81,3.6) 18(-5.08,3.6)
Top Overlay:
  text "1" at -4.445,-2.54 h1.97
Mechanical 16:
  rectangle: -5.33,-4.44 -4.83,-3.11
  rectangle: -4.06,-4.44 -3.56,-3.11
  rectangle: -2.79,-4.44 -2.29,-3.11
  rectangle: -1.52,-4.44 -1.02,-3.11
  rectangle: -0.25,-4.44 0.25,-3.11
  rectangle: 1.02,-4.44 1.52,-3.11
  rectangle: 2.29,-4.44 2.79,-3.11
  rectangle: 3.56,-4.44 4.06,-3.11
  rectangle: 4.83,-4.44 5.33,-3.11
  rectangle: 4.83,3.11 5.33,4.44
  rectangle: 3.56,3.11 4.06,4.44
  rectangle: 2.29,3.11 2.79,4.44
  rectangle: 1.02,3.11 1.52,4.44
  rectangle: -0.25,3.11 0.25,4.44
  rectangle: -1.52,3.11 -1.02,4.44
  rectangle: -2.79,3.11 -2.29,4.44
  rectangle: -4.06,3.11 -3.56,4.44
  rectangle: -5.33,3.11 -4.83,4.44
  lines w0.203: -6.88,-3.01 6.88,-3.01 6.88,3.01 -6.88,3.01 -6.88,-3.01
Mechanical 27:
  lines w0.2: -6.9,-4.9 -6.9,4.9 6.9,4.9 6.9,-4.9 -6.9,-4.9

## SOP20 [mm]
pads (20):
  rect 0.6x2.2 smd: 1(-5.715,-3.6) 2(-4.445,-3.6) 3(-3.175,-3.6) 4(-1.905,-3.6) 5(-0.635,-3.6) 6(0.635,-3.6) 7(1.905,-3.6) 8(3.175,-3.6) 9(4.445,-3.6) 10(5.715,-3.6) 11(5.715,3.6) 12(4.445,3.6) 13(3.175,3.6) 14(1.905,3.6) 15(0.635,3.6) 16(-0.635,3.6) 17(-1.905,3.6) 18(-3.175,3.6) 19(-4.445,3.6) 20(-5.715,3.6)
Top Overlay:
  text "1" at -5.08,-2.54 h1.97
Mechanical 16:
  rectangle: -5.965,-4.44 -5.465,-3.11
  rectangle: -4.695,-4.44 -4.195,-3.11
  rectangle: -3.425,-4.44 -2.925,-3.11
  rectangle: -2.155,-4.44 -1.655,-3.11
  rectangle: -0.885,-4.44 -0.385,-3.11
  rectangle: 0.385,-4.44 0.885,-3.11
  rectangle: 1.655,-4.44 2.155,-3.11
  rectangle: 2.925,-4.44 3.425,-3.11
  rectangle: 4.195,-4.44 4.695,-3.11
  rectangle: 5.465,-4.44 5.965,-3.11
  rectangle: 5.465,3.11 5.965,4.44
  rectangle: 4.195,3.11 4.695,4.44
  rectangle: 2.925,3.11 3.425,4.44
  rectangle: 1.655,3.11 2.155,4.44
  rectangle: 0.385,3.11 0.885,4.44
  rectangle: -0.885,3.11 -0.385,4.44
  rectangle: -2.155,3.11 -1.655,4.44
  rectangle: -3.425,3.11 -2.925,4.44
  rectangle: -4.695,3.11 -4.195,4.44
  rectangle: -5.965,3.11 -5.465,4.44
  lines w0.203: -6.88,-3.01 6.88,-3.01 6.88,3.01 -6.88,3.01 -6.88,-3.01
Mechanical 27:
  lines w0.2: -6.9,-4.9 -6.9,4.9 6.9,4.9 6.9,-4.9 -6.9,-4.9

## SOP22 [mm]
pads (22):
  rect 0.6x2.2 smd: 1(-6.35,-4.5) 2(-5.08,-4.5) 3(-3.81,-4.5) 4(-2.54,-4.5) 5(-1.27,-4.5) 6(0,-4.5) 7(1.27,-4.5) 8(2.54,-4.5) 9(3.81,-4.5) 10(5.08,-4.5) 11(6.35,-4.5) 12(6.35,4.5) 13(5.08,4.5) 14(3.81,4.5) 15(2.54,4.5) 16(1.27,4.5) 17(0,4.5) 18(-1.27,4.5) 19(-2.54,4.5) 20(-3.81,4.5) 21(-5.08,4.5) 22(-6.35,4.5)
Top Overlay:
  text "1" at -5.715,-3.175 h1.97
Mechanical 16:
  rectangle: -6.6,-5.39 -6.1,-4.06
  rectangle: -5.33,-5.39 -4.83,-4.06
  rectangle: -4.06,-5.39 -3.56,-4.06
  rectangle: -2.79,-5.39 -2.29,-4.06
  rectangle: -1.52,-5.39 -1.02,-4.06
  rectangle: -0.25,-5.39 0.25,-4.06
  rectangle: 1.02,-5.39 1.52,-4.06
  rectangle: 2.29,-5.39 2.79,-4.06
  rectangle: 3.56,-5.39 4.06,-4.06
  rectangle: 4.83,-5.39 5.33,-4.06
  rectangle: 6.1,-5.39 6.6,-4.06
  rectangle: 6.1,4.06 6.6,5.39
  rectangle: 4.83,4.06 5.33,5.39
  rectangle: 3.56,4.06 4.06,5.39
  rectangle: 2.29,4.06 2.79,5.39
  rectangle: 1.02,4.06 1.52,5.39
  rectangle: -0.25,4.06 0.25,5.39
  rectangle: -1.52,4.06 -1.02,5.39
  rectangle: -2.79,4.06 -2.29,5.39
  rectangle: -4.06,4.06 -3.56,5.39
  rectangle: -5.33,4.06 -4.83,5.39
  rectangle: -6.6,4.06 -6.1,5.39
  lines w0.203: -8.145,-3.96 8.145,-3.96 8.145,3.96 -8.145,3.96 -8.145,-3.96
Mechanical 27:
  lines w0.2: -8.4,-5.9 -8.4,5.9 8.4,5.9 8.4,-5.9 -8.4,-5.9

## SOP24 [mm]
pads (24):
  rect 0.6x2.2 smd: 1(-6.985,-4.5) 2(-5.715,-4.5) 3(-4.445,-4.5) 4(-3.175,-4.5) 5(-1.905,-4.5) 6(-0.635,-4.5) 7(0.635,-4.5) 8(1.905,-4.5) 9(3.175,-4.5) 10(4.445,-4.5) 11(5.715,-4.5) 12(6.985,-4.5) 13(6.985,4.5) 14(5.715,4.5) 15(4.445,4.5) 16(3.175,4.5) 17(1.905,4.5) 18(0.635,4.5) 19(-0.635,4.5) 20(-1.905,4.5) 21(-3.175,4.5) 22(-4.445,4.5) 23(-5.715,4.5) 24(-6.985,4.5)
Top Overlay:
  text "1" at -6.35,-3.175 h1.97
Mechanical 16:
  rectangle: -7.235,-5.39 -6.735,-4.06
  rectangle: -5.965,-5.39 -5.465,-4.06
  rectangle: -4.695,-5.39 -4.195,-4.06
  rectangle: -3.425,-5.39 -2.925,-4.06
  rectangle: -2.155,-5.39 -1.655,-4.06
  rectangle: -0.885,-5.39 -0.385,-4.06
  rectangle: 0.385,-5.39 0.885,-4.06
  rectangle: 1.655,-5.39 2.155,-4.06
  rectangle: 2.925,-5.39 3.425,-4.06
  rectangle: 4.195,-5.39 4.695,-4.06
  rectangle: 5.465,-5.39 5.965,-4.06
  rectangle: 6.735,-5.39 7.235,-4.06
  rectangle: 6.735,4.06 7.235,5.39
  rectangle: 5.465,4.06 5.965,5.39
  rectangle: 4.195,4.06 4.695,5.39
  rectangle: 2.925,4.06 3.425,5.39
  rectangle: 1.655,4.06 2.155,5.39
  rectangle: 0.385,4.06 0.885,5.39
  rectangle: -0.885,4.06 -0.385,5.39
  rectangle: -2.155,4.06 -1.655,5.39
  rectangle: -3.425,4.06 -2.925,5.39
  rectangle: -4.695,4.06 -4.195,5.39
  rectangle: -5.965,4.06 -5.465,5.39
  rectangle: -7.235,4.06 -6.735,5.39
  lines w0.203: -8.145,-3.96 8.145,-3.96 8.145,3.96 -8.145,3.96 -8.145,-3.96
Mechanical 27:
  lines w0.2: -8.4,-5.9 -8.4,5.9 8.4,5.9 8.4,-5.9 -8.4,-5.9